# Altium footprint library ic.PcbLib: 68 footprints (part 2 of 5)
Each footprint in its own frame and in the unit in brackets; x right, y up, seen from the top. Pads: shape width x height; smd on the part's side, far side on the other; paste and mask are expansions set on the pad; w line width, h text height; cw(c..) or ccw(c..) is an arc to the next point about the centre after c.
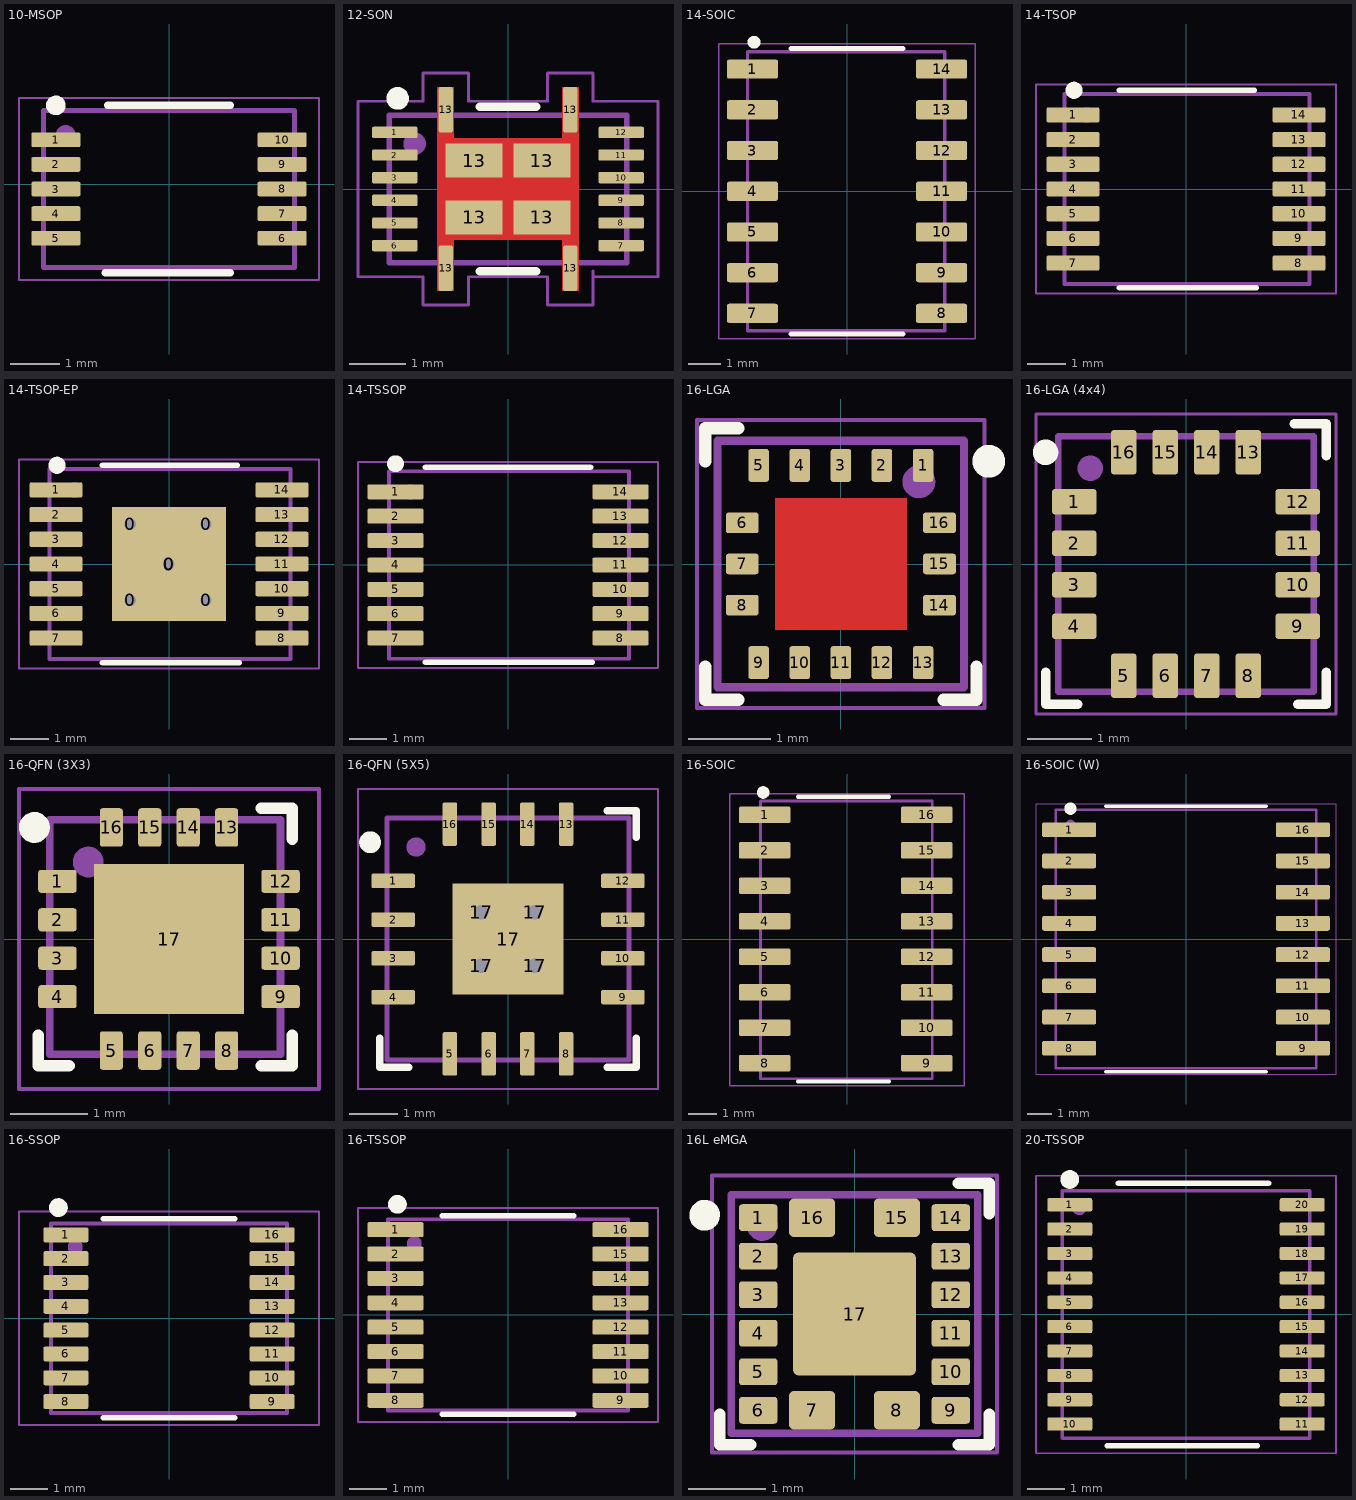
[diagram p1: the footprints below, top view; thin cyan lines are the x and y axes]

## 10-MSOP [mm]
height 1.1
pads (10):
  rrect25% 1x0.3 smd: 1(-2.3,0.9) 2(-2.3,0.4) 3(-2.3,-0.1) 4(-2.3,-0.6) 5(-2.3,-1.1) 6(2.3,-1.1) 7(2.3,-0.6) 8(2.3,-0.1) 9(2.3,0.4) 10(2.3,0.9)
Top Overlay:
  circle w0.2: c-2.3,1.6 r0.1
  lines w0.15: -1.3,-1.8 1.25,-1.8 ; -1.25,1.6 1.25,1.6
Top Assy:
  circle w0.2: c-2.1,1 r0.1
  lines w0.1: -2.55,-1.7 -2.55,1.5 2.55,1.5 2.55,-1.7 -2.55,-1.7
  text ".Designator" at 0,0 h1
Top Cortyard:
  lines w0.05: -3.05,-1.95 -3.05,1.75 3.05,1.75 3.05,-1.95 -3.05,-1.95
3D body "User Library-MSOP10-1.step": height 1.09, standoff 0, extent -2.575,-1.7 2.575,1.5

## 12-SON [mm]
pads (20):
  rrect25% 0.8x0.2 smd: 1(-2,1) 2(-2,0.6) 3(-2,0.2) 4(-2,-0.2) 5(-2,-0.6) 6(-2,-1) 7(2,-1) 8(2,-0.6) 9(2,-0.2) 10(2,0.2) 11(2,0.6) 12(2,1)
  rrect25% 0.25x0.8 smd: 13(-1.1,-1.4) 13(-1.1,1.4) 13(1.1,-1.4) 13(1.1,1.4)
  rect 1x0.6 smd: 13(-0.6,-0.5) 13(-0.6,0.5) 13(0.6,-0.5) 13(0.6,0.5)
Top Layer:
  rectangle: -1.25,-1.8 -0.95,1.8
  rectangle: 0.95,-1.8 1.25,1.8
  rectangle: -1.25,-0.9 1.25,0.9
Top Overlay:
  circle w0.2: c-1.95,1.6 r0.1
  lines w0.15: -0.5,-1.45 0.5,-1.45 ; -0.5,1.45 0.5,1.45
Top Assy:
  circle w0.2: c-1.65,0.8 r0.1
  lines w0.1: -2.1,-1.3 2.1,-1.3 2.1,1.3 -2.1,1.3 -2.1,-1.3
  text ".Designator" at 0,0 h1
Top Cortyard:
  lines w0.05: 1.5,-1.55 2.65,-1.55 2.65,1.55 1.5,1.55 1.5,2.05 0.7,2.05 0.7,1.55 -0.7,1.55 -0.7,2.05 -1.5,2.05 -1.5,1.55 -2.65,1.55 -2.65,-1.5 -2.65,-1.55 -1.5,-1.55 -1.5,-2.05 -0.7,-2.05 -0.7,-1.55 0.7,-1.55 0.7,-2.05 1.5,-2.05 1.5,-1.45
3D body "User Library-SON-12-2.step": height 1, standoff -0.05, extent -2.075,-1.3 2.075,1.3

## 14-SOIC [mm]
pads (14):
  rrect25% 1.6x0.6 smd: 1(-2.95,3.81) 2(-2.95,2.54) 3(-2.95,1.27) 4(-2.95,0) 5(-2.95,-1.27) 6(-2.95,-2.54) 7(-2.95,-3.81) 8(2.95,-3.81) 9(2.95,-2.54) 10(2.95,-1.27) 11(2.95,0) 12(2.95,1.27) 13(2.95,2.54) 14(2.95,3.81)
Top Overlay:
  circle w0.2: c-2.9,4.65 r0.1
  lines w0.15: -1.75,-4.45 1.75,-4.45 ; -1.75,4.45 1.75,4.45
Top Assy:
  circle w0.2: c-2.5,3.75 r0.1
  lines w0.1: -3.1,-4.35 -3.1,4.35 3.05,4.35 3.05,-4.35 -3.1,-4.35
  text ".Designator" at 0,0 h1
Top Cortyard:
  lines w0.05: 4,3.9 4,-4.6 -4,-4.6 -4,4.6 4,4.6 4,3.91
3D body "User Library-so14-2.STEP": height 1.78, standoff 0.01, extent -3.068,-4.34 3.069,4.36

## 14-TSOP [mm]
height 1.2
pads (14):
  rrect25% 1.4x0.4 smd: 1(-2.975,1.95) 2(-2.975,1.3) 3(-2.975,0.65) 4(-2.975,0) 5(-2.975,-0.65) 6(-2.975,-1.3) 7(-2.975,-1.95) 8(2.975,-1.95) 9(2.975,-1.3) 10(2.975,-0.65) 11(2.975,0) 12(2.975,0.65) 13(2.975,1.3) 14(2.975,1.95)
Top Overlay:
  circle w0.25: c-2.95,2.6 r0.1
  lines w0.15: -1.75,-2.6 1.85,-2.6 ; -1.75,2.6 1.8,2.6
Top Assy:
  lines w0.1: -3.2,-2.5 -3.2,2.5 3.25,2.5 3.25,-2.5 -3.2,-2.5 ; 3.225,2.5 3.225,2.5
  lines w0.2: -2.521,1.95 ccw(c-2.621,1.95) -2.521,1.95
  text ".Designator" at 0,0 h1
Top Cortyard:
  lines w0.05: -3.95,-2.75 -3.95,2.75 3.95,2.75 3.95,-2.75 -0.575,-2.75 -3.95,-2.75
3D body "SW3dPS-TSSOP14-1.STEP": height 1.1, standoff 0, extent -3.175,-2.5 3.225,2.5

## 14-TSOP-EP [mm]
height 1.2
pads (20):
  round 0.6 hole 0.3: 0(-1.025,-0.95) 0(-1.025,1.05) 0(0,0) 0(0.975,-0.95) 0(0.975,1.05)
  rect 3x3 smd: 0(0,0)
  rrect25% 1.4x0.4 smd: 1(-2.975,1.95) 2(-2.975,1.3) 3(-2.975,0.65) 4(-2.975,0) 5(-2.975,-0.65) 6(-2.975,-1.3) 7(-2.975,-1.95) 8(2.975,-1.95) 9(2.975,-1.3) 10(2.975,-0.65) 11(2.975,0) 12(2.975,0.65) 13(2.975,1.3) 14(2.975,1.95)
Top Overlay:
  circle w0.25: c-2.95,2.6 r0.1
  lines w0.15: -1.75,-2.6 1.85,-2.6 ; -1.75,2.6 1.8,2.6
Top Assy:
  circle w0.2: c-2.5,1.95 r0.1
  lines w0.1: -3.15,-2.5 -3.15,2.5 3.2,2.5 3.2,-2.5 -3.15,-2.5
  text ".Designator" at 0,0 h1
Top Cortyard:
  lines w0.05: -3.95,-2.75 -3.95,2.75 3.95,2.75 3.95,-2.75 -0.575,-2.75 -3.95,-2.75
  lines w0.1: -0.5,0 0.5,0 ; 0,-0.5 0,0.5
3D body "SW3dPS-TSSOP14-1.STEP": height 1.1, standoff 0, extent -3.175,-2.5 3.225,2.5

## 14-TSSOP [mm]
height 1.2
pads (14):
  rrect25% 1.5x0.4 smd: 1(-3,1.95) 2(-3,1.3) 3(-3,0.65) 4(-3,0) 5(-3,-0.65) 6(-3,-1.3) 7(-3,-1.95) 8(3,-1.95) 9(3,-1.3) 10(3,-0.65) 11(3,0) 12(3,0.65) 13(3,1.3) 14(3,1.95)
Top Overlay:
  circle w0.25: c-3,2.7 r0.1
  lines w0.15: -2.2,-2.6 2.25,-2.6 ; -2.2,2.6 2.2,2.6
Top Assy:
  circle w0.2: c-2.6,1.95 r0.1
  lines w0.1: 3.225,2.5 3.225,2.5 ; 3.225,2.5 3.225,-2.5 -3.175,-2.5 -3.175,2.5 3.225,2.5
  text ".Designator" at 0,0 h1
Top Cortyard:
  lines w0.05: -4,-2.75 4,-2.75 4,2.75 -4,2.75 -4,-2.75
3D body "SW3dPS-TSSOP14-1.STEP": height 1.1, standoff 0, extent -3.175,-2.5 3.225,2.5

## 16-LGA [mm] "PSON, 10-Leads, Body 3,00x3,00mm, Pitch 0,50mm, IPC Medium Density"
height 1
pads (16):
  rrect25% 0.25x0.4 smd: 1(1,1.2) 2(0.5,1.2) 3(0,1.2) 4(-0.5,1.2) 5(-1,1.2) 9(-1,-1.2) 10(-0.5,-1.2) 11(0,-1.2) 12(0.5,-1.2) 13(1,-1.2)
  rrect25% 0.4x0.25 smd: 6(-1.2,0.5) 7(-1.2,0) 8(-1.2,-0.5) 14(1.2,-0.5) 15(1.2,0) 16(1.2,0.5)
Top Layer:
  pour cut-out: -0.8,0.8 -0.8,-0.8 0.8,-0.8 0.8,0.8
Top Overlay:
  circle w0.2: c1.8,1.25 r0.1
  lines w0.15: -1.65,-1.25 -1.65,-1.65 -1.25,-1.65 ; -1.65,1.25 -1.65,1.65 -1.25,1.65 ; 1.25,-1.65 1.65,-1.65 1.65,-1.25
Top Assy:
  circle w0.2: c0.95,1 r0.1
  lines w0.1: -1.5,-1.5 1.5,-1.5 1.5,1.5 -1.5,1.5 -1.5,-1.5
  text ".Designator" at 0,0 h1
Top Cortyard:
  lines w0.05: -1.75,-1.75 -1.75,1.75 1.75,1.75 1.75,-1.75 -1.75,-1.75
3D body "User Library-LIS331AL.STEP": height 1.01, standoff -0.01, extent -1.5,-1.5 1.5,1.5

## 16-LGA (4x4) [mm] "PSON, 10-Leads, Body 3,00x3,00mm, Pitch 0,50mm, IPC Medium Density"
height 1
pads (16):
  rrect25% 0.7x0.4 smd: 1(-1.75,0.975) 2(-1.75,0.325) 3(-1.75,-0.325) 4(-1.75,-0.975) 9(1.75,-0.975) 10(1.75,-0.325) 11(1.75,0.325) 12(1.75,0.975)
  rrect25% 0.4x0.7 smd: 5(-0.975,-1.75) 6(-0.325,-1.75) 7(0.325,-1.75) 8(0.975,-1.75) 13(0.975,1.75) 14(0.325,1.75) 15(-0.325,1.75) 16(-0.975,1.75)
Top Overlay:
  circle w0.2: c-2.2,1.75 r0.1
  lines w0.15: -2.2,-1.7 -2.2,-2.2 -1.7,-2.2 ; 1.7,2.2 2.2,2.2 2.2,1.7 ; 1.75,-2.2 2.2,-2.2 2.2,-1.7
Top Assy:
  circle w0.2: c-1.5,1.5 r0.1
  lines w0.1: -2,-2 2,-2 2,2 -2,2 -2,-2
  text ".Designator" at 0,0 h1
Top Cortyard:
  lines w0.05: -2.35,-2.35 2.35,-2.35 2.35,2.35 -2.35,2.35 -2.35,-2.35
3D body "User Library-LGA-16.step": height 0.98, standoff 0, extent -2,-2 2,2

## 16-QFN (3X3) [mm] "QFN, 16-Leads, Body 3,00x3,00mm, Pitch 0,5mm, Thermal Pad 1,95x1,95mm"
height 0.8
pads (17):
  rrect25% 0.5x0.3 smd: 1(-1.45,0.75) 2(-1.45,0.25) 3(-1.45,-0.25) 4(-1.45,-0.75) 9(1.45,-0.75) 10(1.45,-0.25) 11(1.45,0.25) 12(1.45,0.75)
  rrect25% 0.3x0.5 smd: 5(-0.75,-1.45) 6(-0.25,-1.45) 7(0.25,-1.45) 8(0.75,-1.45) 13(0.75,1.45) 14(0.25,1.45) 15(-0.25,1.45) 16(-0.75,1.45)
  rect 1.95x1.95 smd: 17(0,0)
Top Overlay:
  circle w0.2: c-1.75,1.45 r0.1
  lines w0.15: -1.7,-1.25 -1.7,-1.65 -1.3,-1.65 ; 1.2,-1.65 1.6,-1.65 1.6,-1.25 ; 1.2,1.7 1.6,1.7 1.6,1.3
Top Assy:
  circle w0.2: c-1.05,1 r0.1
  lines w0.1: -1.55,-1.5 1.45,-1.5 1.45,1.55 -1.55,1.55 -1.55,-1.5
  text ".Designator" at 0,0 h1
Top Cortyard:
  lines w0.05: -1.95,-1.95 -1.95,1.95 1.95,1.95 1.95,-1.95 -1.95,-1.95
3D body "User Library-QFN-16_3x3.STEP": height 0.9, standoff 0, extent -1.549,-1.521 1.493,1.521

## 16-QFN (5X5) [mm] "QFN, 16-Leads, Body 5,00x5,00mm, Pitch 0,80mm, Thermal Pad 2,29x2,29mm, IPC Medium Density"
height 0.8
pads (21):
  rrect25% 0.9x0.3 smd: 1(-2.375,1.2) 2(-2.375,0.4) 3(-2.375,-0.4) 4(-2.375,-1.2) 9(2.375,-1.2) 10(2.375,-0.4) 11(2.375,0.4) 12(2.375,1.2)
  rrect25% 0.3x0.9 smd: 5(-1.2,-2.375) 6(-0.4,-2.375) 7(0.4,-2.375) 8(1.2,-2.375) 13(1.2,2.375) 14(0.4,2.375) 15(-0.4,2.375) 16(-1.2,2.375)
  round 0.7 hole 0.3: 17(-0.55,-0.55) 17(-0.55,0.55) 17(0.55,-0.55) 17(0.55,0.55)
  rect 2.29x2.29 smd: 17(0,0)
Top Overlay:
  circle w0.25: c-2.85,2 r0.1
  lines w0.15: -2.65,-2.05 -2.65,-2.65 -2.05,-2.65 ; 2.05,-2.65 2.65,-2.65 2.65,-2.05 ; 2.05,2.65 2.65,2.65 2.65,2.1
Top Assy:
  circle w0.2: c-1.9,1.9 r0.1
  lines w0.1: -2.5,-2.5 -2.5,2.5 2.5,2.5 2.5,-2.5 -2.5,-2.5
  text ".Designator" at 0,0 h1
Top Cortyard:
  lines w0.05: -3.1,-3.1 -3.1,3.1 3.1,3.1 3.1,-3.1 -3.1,-3.1
3D body "QFN5x5_16pins.step": height 0.75, standoff 0, extent -2.52,-2.52 2.52,2.52

## 16-SOIC [mm]
height 2.65
pads (16):
  rrect25% 1.85x0.6 smd: 1(-2.95,4.45) 2(-2.95,3.18) 3(-2.95,1.91) 4(-2.95,0.64) 5(-2.95,-0.63) 6(-2.95,-1.9) 7(-2.95,-3.17) 8(-2.95,-4.44) 9(2.85,-4.44) 10(2.85,-3.17) 11(2.85,-1.9) 12(2.85,-0.63) 13(2.85,0.64) 14(2.85,1.91) 15(2.85,3.18) 16(2.85,4.45)
Top Overlay:
  circle w0.25: c-3,5.25 r0.1
  lines w0.15: -1.75,-5.1 1.5,-5.1 ; -1.75,5.1 1.5,5.1
Top Assy:
  circle w0.2: c-2.6,4.4 r0.1
  lines w0.1: -3.1,-5 3.05,-5 3.05,4.95 -3.1,4.95 -3.1,-5
  text ".Designator" at 0,0 h1
Top Cortyard:
  lines w0.05: -4.2,-5.25 -4.2,5.2 4.2,5.2 4.2,-5.25 -4.2,-5.25
3D body "User Library-so16-1.STEP": height 1.73, standoff -0.04, extent -3.075,-5.018 3.062,4.952

## 16-SOIC (W) [mm]
height 2.65
pads (16):
  rrect25% 2.2x0.6 smd: 1(-4.75,4.445) 2(-4.75,3.175) 3(-4.75,1.905) 4(-4.75,0.635) 5(-4.75,-0.635) 6(-4.75,-1.905) 7(-4.75,-3.175) 8(-4.75,-4.445) 9(4.75,-4.445) 10(4.75,-3.175) 11(4.75,-1.905) 12(4.75,-0.635) 13(4.75,0.635) 14(4.75,1.905) 15(4.75,3.175) 16(4.75,4.445)
Top Overlay:
  circle w0.3: c-4.7,5.3 r0.1
  lines w0.15: -3.25,-5.4 3.25,-5.4 ; -3.25,5.4 3.25,5.4
Top Assy:
  circle w0.2: c-4.7,4.65 r0.1
  lines w0.1: -5.3,-5.25 -5.3,5.25 5.3,5.25 5.3,-5.25 -5.3,-5.25
  text ".Designator" at 0,0 h1
Top Cortyard:
  lines w0.05: -6.1,-5.5 6.1,-5.5 6.1,5.5 -6.1,5.5 -6.1,-5.5
3D body "User Library-SOIC16_Wide_JEDEC_MS-013AA.STEP": height 2.62, standoff -0.03, extent -5.315,-5.25 5.315,5.25

## 16-SSOP [mm] "TSOP, 16-Leads, Body 5,00x4,00mm, Pitch 0,635mm, IPC Medium Density"
height 1.2
pads (16):
  rrect25% 1.2x0.4 smd: 1(-2.75,2.223) 2(-2.75,1.588) 3(-2.75,0.953) 4(-2.75,0.318) 5(-2.75,-0.318) 6(-2.75,-0.953) 7(-2.75,-1.588) 8(-2.75,-2.223) 9(2.75,-2.223) 10(2.75,-1.588) 11(2.75,-0.953) 12(2.75,-0.318) 13(2.75,0.318) 14(2.75,0.953) 15(2.75,1.588) 16(2.75,2.223)
Top Overlay:
  circle w0.25: c-2.95,2.95 r0.125
  lines w0.15: -1.75,-2.65 1.75,-2.65 ; -1.75,2.65 1.75,2.65
Top Assy:
  circle w0.2: c-2.5,1.9 r0.1
  lines w0.1: -3.15,-2.525 -3.15,2.525 3.15,2.525 3.15,-2.525 -3.15,-2.525
  text ".Designator" at -1.025,-0.225 h1
Top Cortyard:
  lines w0.05: -4,-2.85 -4,2.85 4,2.85 4,-2.85 -4,-2.85
3D body "User Library-SSOP 16-pin.STEP": height 1.75, standoff 0.01, extent -3.127,-2.5 3.127,2.5

## 16-TSSOP [mm] "TSOP, 16-Leads, Body 5,00x4,40mm, Pitch 0,65mm, IPC Medium Density"
height 1.2
pads (16):
  rrect25% 1.5x0.4 smd: 1(-3,2.275) 2(-3,1.625) 3(-3,0.975) 4(-3,0.325) 5(-3,-0.325) 6(-3,-0.975) 7(-3,-1.625) 8(-3,-2.275) 9(3,-2.275) 10(3,-1.625) 11(3,-0.975) 12(3,-0.325) 13(3,0.325) 14(3,0.975) 15(3,1.625) 16(3,2.275)
Top Overlay:
  circle w0.25: c-2.95,2.95 r0.125
  lines w0.15: -1.75,-2.65 1.75,-2.65 ; -1.75,2.65 1.75,2.65
Top Assy:
  circle w0.2: c-2.5,1.9 r0.1
  lines w0.1: -3.2,-2.55 -3.2,2.55 3.2,2.55 3.2,-2.55 -3.2,-2.55
  text ".Designator" at 0,0 h1
Top Cortyard:
  lines w0.05: -4,-2.85 -4,2.85 4,2.85 4,-2.85 -4,-2.85
3D body "User Library-TSSOP-16-1.step": height 1.1, standoff 0, extent -3.2,-2.5 3.2,2.5

## 16L eMGA [mm] "TSOP, 16-Leads, Body 5,00x4,40mm, Pitch 0,65mm, IPC Medium Density"
height 1.2
pads (17):
  rrect25% 0.5x0.35 smd: 1(-1.25,1.25) 2(-1.25,0.75) 3(-1.25,0.25) 4(-1.25,-0.25) 5(-1.25,-0.75) 6(-1.25,-1.25) 9(1.25,-1.25) 10(1.25,-0.75) 11(1.25,-0.25) 12(1.25,0.25) 13(1.25,0.75) 14(1.25,1.25)
  rrect25% 0.6x0.5 smd: 7(-0.55,-1.25) 8(0.55,-1.25) 15(0.55,1.25) 16(-0.55,1.25)
  rrect10% 1.6x1.6 smd: 17(0,0)
Top Overlay:
  lines w0.15: -1.75,-1.3 -1.75,-1.7 -1.35,-1.7 ; 1.35,-1.7 1.75,-1.7 1.75,-1.3 ; 1.35,1.7 1.75,1.7 1.75,1.3
  lines w0.2: -1.85,1.25 cw(c-1.945,1.282) -1.845,1.282
Top Assy:
  circle w0.2: c-1.2,1.15 r0.1
  lines w0.1: -1.6,-1.55 1.6,-1.55 1.6,1.55 -1.6,1.55 -1.6,-1.55
  text ".Designator" at 0,0 h1
Top Cortyard:
  lines w0.05: -1.85,-1.8 1.85,-1.8 1.85,1.8 -1.85,1.8 -1.85,-1.8
3D body "User Library-21-100298_90-100110_MXM_16-eMGA.step": height 1.81, standoff 0, extent -1.575,-1.575 1.575,1.575

## 20-TSSOP [mm]
height 1.2
pads (20):
  rrect25% 1.2x0.35 smd: 1(-3.1,2.925) 2(-3.1,2.275) 3(-3.1,1.625) 4(-3.1,0.975) 5(-3.1,0.325) 6(-3.1,-0.325) 7(-3.1,-0.975) 8(-3.1,-1.625) 9(-3.1,-2.275) 10(-3.1,-2.925) 11(3.1,-2.925) 12(3.1,-2.275) 13(3.1,-1.625) 14(3.1,-0.975) 15(3.1,-0.325) 16(3.1,0.325) 17(3.1,0.975) 18(3.1,1.625) 19(3.1,2.275) 20(3.1,2.925)
Top Overlay:
  circle w0.25: c-3.1,3.6 r0.125
  lines w0.15: -2.1,-3.5 1.9,-3.5 ; -1.8,3.5 2.2,3.5
Top Assy:
  circle w0.2: c-2.846,2.85 r0.1
  lines w0.1: -3.3,-3.3 -3.3,3.3 3.3,3.3 3.3,-3.3 -3.3,-3.3
  text ".Designator" at 0,0 h1
Top Cortyard:
  lines w0.05: -4,-3.7 -4,3.7 4,3.7 4,-3.7 -4,-3.7
3D body "tssop-20-1.STEP": height 1.1, standoff -0.1, extent -3.3,-3.3 3.3,3.3